# Altium footprint library Pezo_imp.PCBLIB: 98 footprints (part 2 of 7)
Each footprint in its own frame and in the unit in brackets; x right, y up, seen from the top. Pads: shape width x height; smd on the part's side, far side on the other; paste and mask are expansions set on the pad; w line width, h text height; cw(c..) or ccw(c..) is an arc to the next point about the centre after c.
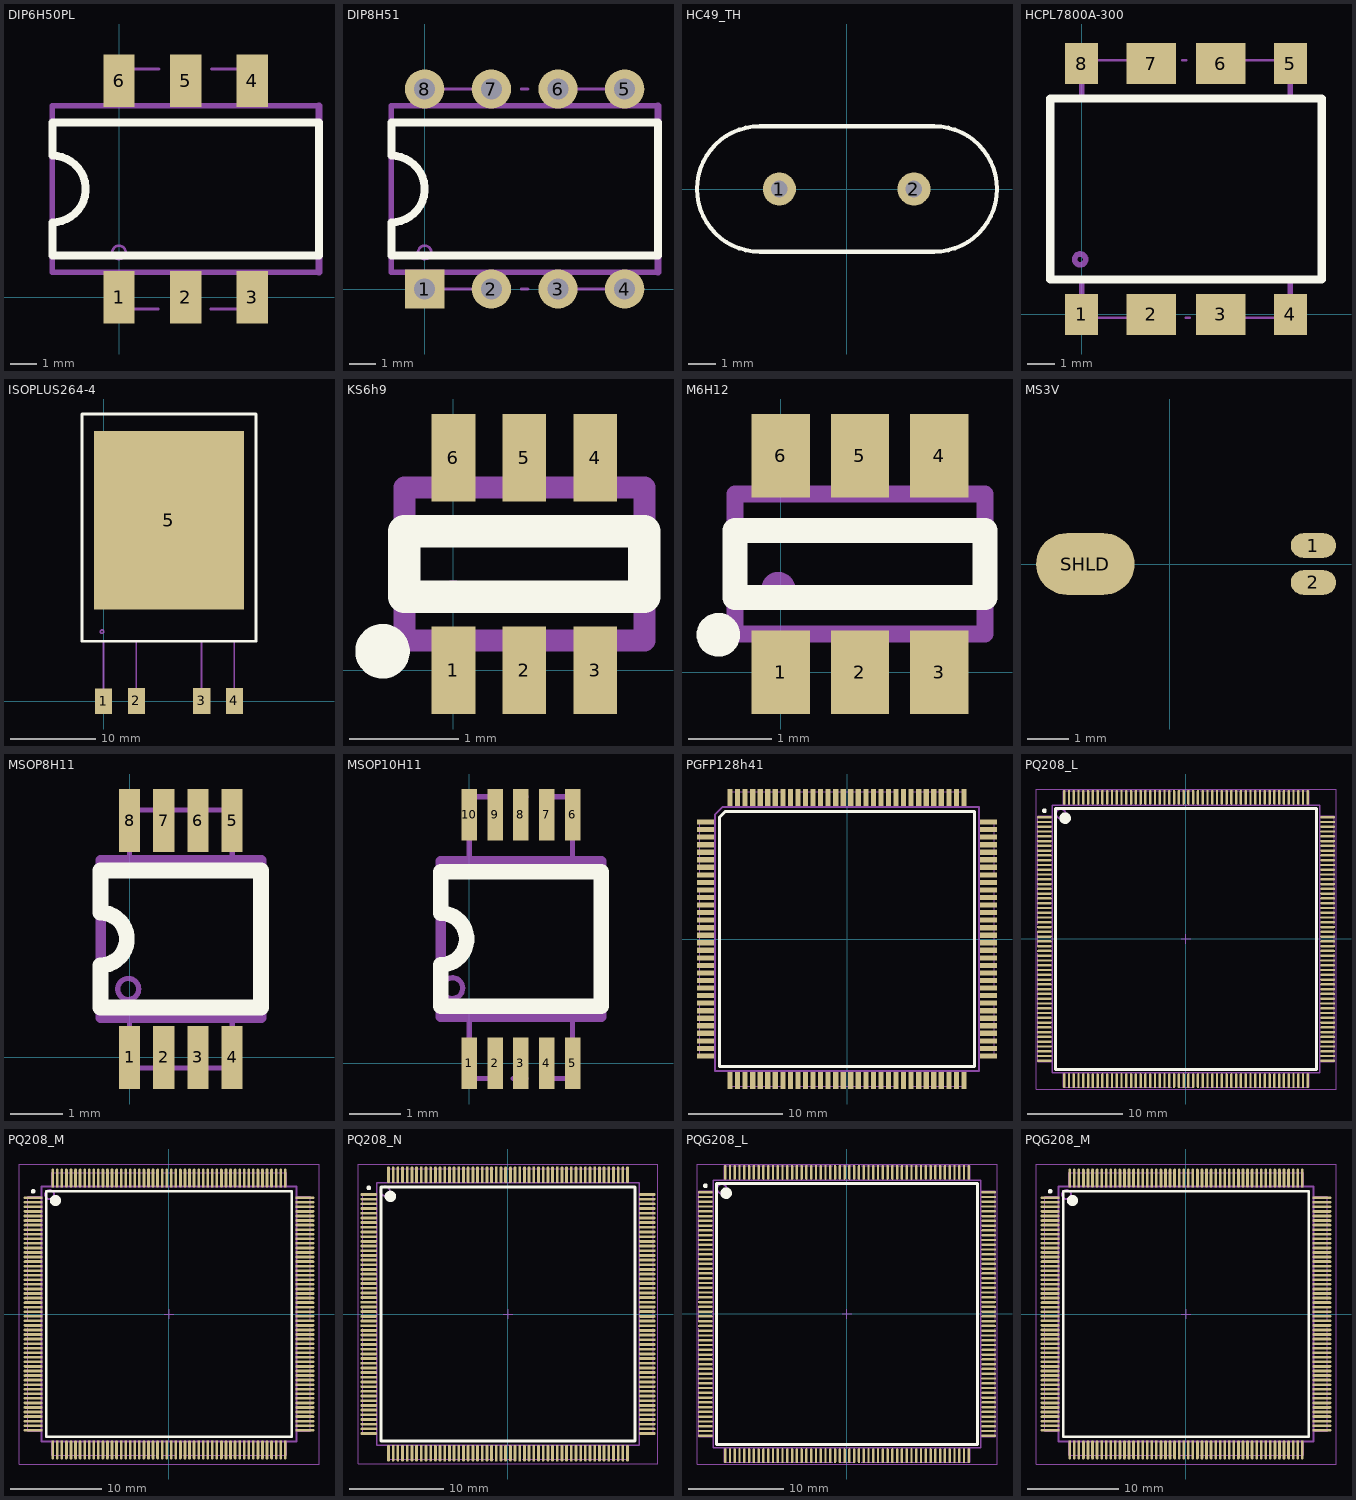
[diagram p1: the footprints below, top view; thin cyan lines are the x and y axes]

## DIP6H50PL [mm]
height 5
pads (6):
  rect 1.2x2 smd: 1(0,0) 2(2.54,0) 3(5.08,0) 4(5.08,8.255) 5(2.54,8.255) 6(0,8.255)
Top Overlay:
  lines w0.3: -2.54,1.587 7.62,1.587 7.62,6.667 -2.54,6.667 -2.54,5.397 cw(c-2.54,4.127) -2.54,2.857 -2.54,1.587
Mechanical 1:
  circle w0.1: c0,1.714 r0.254
  lines w0.025: -2.54,2.857 ccw(c-2.54,4.127) -2.54,5.397
  lines w0.1: 0,-0.445 1.5,-0.445 ; 0.024,8.7 1.524,8.7 ; 2.35,-0.464 2.604,-0.464 ; 2.374,8.68 2.628,8.68 ; 3.5,-0.445 5.1,-0.445 ; 3.524,8.7 5.124,8.7
  lines w0.2: 0,-0.445 0,0.953 ; 0.024,7.302 0.024,8.7 ; 5.1,-0.445 5.1,0.953 ; 5.124,7.302 5.124,8.7 ; 7.62,0.953 -2.54,0.953 -2.54,7.302 7.62,7.302
  lines w0.25: 7.62,0.953 7.62,7.302
  text "6" at -0.19,5.957 h1.5
  text ".Comment" at -0.21,2.99 h1.5
  text ".Designator" at 1.38,4.69 h1.5
3D body "DIP6h50pl.stp": height 5.02, standoff 0, extent -2.545,-0.423 7.615,8.677

## DIP8H51 [mm]
height 5.1
pads (8):
  rect 1.5x1.5 hole 0.8: 1(0,0)
  round 1.5 hole 0.8: 2(2.54,0) 3(5.08,0) 4(7.62,0) 5(7.62,7.62) 6(5.08,7.62) 7(2.54,7.62) 8(0,7.62)
Top Overlay:
  lines w0.3: -1.27,1.27 8.89,1.27 8.89,6.35 -1.27,6.35 -1.27,5.08 cw(c-1.27,3.81) -1.27,2.54 -1.27,1.27
Mechanical 1:
  circle w0.1: c0,1.397 r0.254
  lines w0.025: -1.27,2.54 ccw(c-1.27,3.81) -1.27,5.08
  lines w0.1: 0,0 2.54,0 ; 0,7.62 2.54,7.62 ; 3.683,0 3.937,0 ; 3.683,7.62 3.937,7.62 ; 5.08,0 7.62,0 ; 5.08,7.62 7.62,7.62
  lines w0.2: 0,0 0,0.635 ; 0,6.985 0,7.62 ; 7.62,0 7.62,0.635 ; 7.62,6.985 7.62,7.62 ; 8.89,0.635 -1.27,0.635 -1.27,6.985 8.89,6.985
  lines w0.25: 8.89,0.635 8.89,6.985
  text "8" at -0.19,5.64 h1.5
  text ".Comment" at 1.17,2.62 h1.5
  text ".Designator" at 2.76,4.32 h1.5
3D body "DIP8h51.stp": height 5.12, standoff -3, extent -1.325,-0.15 8.975,7.74

## HC49_TH [mm]
pads (2):
  round 1.2 hole 0.6: 1(-2.44,0) 2(2.44,0)
Top Overlay:
  lines w0.15: -3.15,-2.275 cw(c-3.15,0) -3.15,2.275 3.175,2.275 cw(c3.175,0) 3.175,-2.275 -3.15,-2.275
3D body "User Library-HC49S-1.STEP": height 3.61, standoff -2.99, extent -5.49,-2.245 5.49,2.246

## HCPL7800A-300 [mm]
height 5
pads (8):
  rect 1.2x1.5 smd: 1(0,0) 4(7.62,0) 5(7.62,9.144) 8(0,9.144)
  rect 1.8x1.5 smd: 2(2.54,0) 3(5.08,0) 6(5.08,9.144) 7(2.54,9.144)
Top Overlay:
  lines w0.3: -1.14,1.272 -1.14,7.872 8.76,7.872 8.76,1.272 -1.14,1.272
Mechanical 1:
  circle w0.2: c-0.05,2.004 r0.2
  lines w0.1: 0,-0.127 3.175,-0.127 ; 0,9.271 3.175,9.271 ; 3.683,9.271 3.81,9.271 ; 3.81,-0.127 3.937,-0.127 ; 4.445,-0.127 7.62,-0.127 ; 4.445,9.271 7.62,9.271
  lines w0.2: 0,-0.127 0,1.27 ; 0,7.874 0,9.271 ; 7.62,-0.127 7.62,1.27 ; 7.62,7.874 7.62,9.271 ; -1.14,1.272 -1.14,7.872 8.76,7.872 8.76,1.272 -1.14,1.272
  text "8" at -0.27,6.555 h1.5
  text ".Comment" at 1.51,3.61 h1.5
  text ".Designator" at 3.1,5.31 h1.5
3D body "HCPL7800A-300.stp": height 4.96, standoff 0, extent -1.14,-0.38 8.76,9.52

## ISOPLUS264-4 [mm]
height 5.21
pads (5):
  rect 2x3 smd: 1(0,0) 2(3.835,0.025) 3(11.455,0.025) 4(15.265,0.025)
  rect 17.53x20.85 smd: 5(7.632,21.113)
Top Overlay:
  lines w0.3: -2.518,7.013 17.782,7.013 17.782,33.513 -2.518,33.513 -2.518,7.013
Mechanical 1:
  circle w0.2: c-0.188,8.109 r0.2
  lines w0.2: 0,-1.004 0,6.953 ; 3.81,-1.004 3.81,6.966 ; 11.43,-1.004 11.43,6.953 ; 15.252,-1.004 15.252,6.997 ; -2.518,7.013 17.782,7.013 17.782,33.513 -2.518,33.513 -2.518,7.013
  text ".Designator" at 6.23,20.74 h1.5
  text ".Comment" at 4.64,19.04 h1.5
  text "4" at 14.871,8.109 h1.5
3D body "ISOPLUS264-4.stp": height 5.21, standoff 0, extent -2.53,-1.3 17.77,33.5

## KS6h9 [mm]
height 0.9
pads (6):
  rect 0.4x0.8 smd: 1(0,0) 2(0.65,0) 3(1.3,0) 4(1.3,1.95) 5(0.65,1.95) 6(0,1.95)
Top Overlay:
  circle w0.3: c-0.65,0.175 r0.1
  lines w0.3: -0.45,0.675 1.75,0.675 1.75,1.275 -0.45,1.275 -0.45,0.675
Mechanical 1:
  circle w0.2: c0,0.675 r0.05
  lines w0.2: 0,-0.225 0,0.275 ; 0,1.675 0,2.175 ; 0.65,-0.225 0.65,0.275 ; 0.65,1.675 0.65,2.175 ; 1.3,-0.225 1.3,0.275 ; 1.3,1.675 1.3,2.175 ; -0.45,0.275 -0.45,1.675 1.75,1.675 1.75,0.275 -0.45,0.275
  text "6" at -1.05,1.975 h1.5
  text ".Comment" at -1.89,-1.62 h1.5
  text ".Designator" at -0.09,2.65 h1.5
3D body "KS6h09.stp": height 0.91, standoff 0, extent -0.45,-0.13 1.75,2.07

## M6H12 [mm]
height 1.2
pads (6):
  rect 0.7x1 smd: 1(0,0) 2(0.95,0) 3(1.9,0) 4(1.9,2.6) 5(0.95,2.6) 6(0,2.6)
Top Overlay:
  circle w0.3: c-0.75,0.45 r0.112
  lines w0.3: -0.55,0.9 -0.55,1.7 2.45,1.7 2.45,0.9 -0.55,0.9
Mechanical 1:
  circle w0.25: c-0.03,1 r0.08
  lines w0.2: 0,-0.2 0,0.45 ; 0,2.15 0,2.8 ; 0.95,2.14 0.95,2.8 ; 1.9,-0.2 1.9,0.46 ; 1.9,2.15 1.9,2.8 ; -0.55,0.46 2.45,0.46 2.45,2.14 -0.55,2.14 -0.55,0.46 ; 0.95,-0.2 0.95,0.45 0.95,-0.2
  text "6" at -1.1,2.35 h1.5
  text ".Comment" at -1.84,-1.69 h1.5
  text ".Designator" at -0.04,3.49 h1.5
3D body "M6h12.stp": height 1.21, standoff 0, extent -0.5,-0.2 2.4,2.8

## MS3V [mm]
pads (3):
  oval 1.1x0.6 smd: 1(3.5,0.45) 2(3.5,-0.45)
  oval 2.4x1.5 smd: SHLD(-2.05,0)
3D body "User Library-MS2V-T1S.STEP": height 1.51, standoff 0.01, extent -3.2,-0.75 4,0.75

## MSOP8H11 [mm]
height 1.1
pads (8):
  rect 0.4x1.2 smd: 1(0,0) 2(0.65,0) 3(1.3,0) 4(1.95,0) 5(1.95,4.5) 6(1.3,4.5) 7(0.65,4.5) 8(0,4.5)
Top Overlay:
  lines w0.3: -0.55,0.95 2.5,0.95 2.5,3.55 -0.55,3.55 -0.55,2.75 cw(c-0.55,2.25) -0.55,1.75 -0.55,0.95
Mechanical 1:
  circle w0.1: c-0.025,1.3 r0.2
  lines w0.1: 0,0.75 0,-0.2 0.55,-0.2 ; 0,3.75 0,4.7 0.55,4.7 ; 0.85,-0.2 1.1,-0.2 ; 0.85,4.7 1.1,4.7 ; 1.4,-0.2 1.95,-0.2 1.95,0.75 ; 1.4,4.7 1.95,4.7 1.95,3.75
  lines w0.2: -0.55,0.75 2.5,0.75 2.5,3.75 -0.55,3.75 -0.55,0.75
  text ".Designator" at 0.2,5.18 h1.5
  text ".Comment" at -1.67,-1.45 h1.5
  text "8" at -0.127,2.413 h1.5
3D body "MSOP8h11.stp": height 1.11, standoff 0, extent -0.525,-0.2 2.475,4.7

## MSOP10H11 [mm]
height 1.1
pads (10):
  rect 0.3x1 smd: 1(0,0) 2(0.5,0) 3(1,0) 4(1.5,0) 5(2,0) 6(2,4.8) 7(1.5,4.8) 8(1,4.8) 9(0.5,4.8) 10(0,4.8)
Top Overlay:
  lines w0.3: -0.55,1.1 2.55,1.1 2.55,3.7 -0.55,3.7 -0.55,2.9 cw(c-0.55,2.4) -0.55,1.9 -0.55,1.1
Mechanical 1:
  circle w0.1: c-0.325,1.45 r0.2
  lines w0.1: -0.3,3.9 0,3.9 0,5.15 0.55,5.15 ; 0,0.9 0,0.6 0,-0.3 0.55,-0.3 ; 0.85,-0.3 1.1,-0.3 ; 0.9,5.15 1.1,5.15 ; 1.45,-0.3 2,-0.3 2,0.9 ; 1.45,5.15 2,5.15 2,3.9 2.3,3.9
  lines w0.2: -0.55,0.9 2.55,0.9 2.55,3.9 -0.55,3.9 -0.55,0.9
  text "10" at -0.427,2.563 h1.5
  text ".Comment" at -1.55,-1.55 h1.5
  text ".Designator" at 0.19,1.45 h1.5
3D body "MSOP10h11.stp": height 1.11, standoff 0, extent -0.55,-0.15 2.55,4.95

## PGFP128h41 [mm]
height 4.1
pads (128):
  rect 1.8x0.55 smd: 1(-15,12.4) 2(-15,11.6) 3(-15,10.8) 4(-15,10) 5(-15,9.2) 6(-15,8.4) 7(-15,7.6) 8(-15,6.8) 9(-15,6) 10(-15,5.2) 11(-15,4.4) 12(-15,3.6) 13(-15,2.8) 14(-15,2) 15(-15,1.2) 16(-15,0.4) 17(-15,-0.4) 18(-15,-1.2) 19(-15,-2) 20(-15,-2.8) 21(-15,-3.6) 22(-15,-4.4) 23(-15,-5.2) 24(-15,-6) 25(-15,-6.8) 26(-15,-7.6) 27(-15,-8.4) 28(-15,-9.2) 29(-15,-10) 30(-15,-10.8) 31(-15,-11.6) 32(-15,-12.4) 65(15,-12.4) 66(15,-11.6) 67(15,-10.8) 68(15,-10) 69(15,-9.2) 70(15,-8.4) 71(15,-7.6) 72(15,-6.8) 73(15,-6) 74(15,-5.2) 75(15,-4.4) 76(15,-3.6) 77(15,-2.8) 78(15,-2) 79(15,-1.2) 80(15,-0.4) 81(15,0.4) 82(15,1.2) 83(15,2) 84(15,2.8) 85(15,3.6) 86(15,4.4) 87(15,5.2) 88(15,6) 89(15,6.8) 90(15,7.6) 91(15,8.4) 92(15,9.2) 93(15,10) 94(15,10.8) 95(15,11.6) 96(15,12.4)
  rect 0.55x1.8 smd: 33(-12.4,-15) 34(-11.6,-15) 35(-10.8,-15) 36(-10,-15) 37(-9.2,-15) 38(-8.4,-15) 39(-7.6,-15) 40(-6.8,-15) 41(-6,-15) 42(-5.2,-15) 43(-4.4,-15) 44(-3.6,-15) 45(-2.8,-15) 46(-2,-15) 47(-1.2,-15) 48(-0.4,-15) 49(0.4,-15) 50(1.2,-15) 51(2,-15) 52(2.8,-15) 53(3.6,-15) 54(4.4,-15) 55(5.2,-15) 56(6,-15) 57(6.8,-15) 58(7.6,-15) 59(8.4,-15) 60(9.2,-15) 61(10,-15) 62(10.8,-15) 63(11.6,-15) 64(12.4,-15) 97(12.4,15) 98(11.6,15) 99(10.8,15) 100(10,15) 101(9.2,15) 102(8.4,15) 103(7.6,15) 104(6.8,15) 105(6,15) 106(5.2,15) 107(4.4,15) 108(3.6,15) 109(2.8,15) 110(2,15) 111(1.2,15) 112(0.4,15) 113(-0.4,15) 114(-1.2,15) 115(-2,15) 116(-2.8,15) 117(-3.6,15) 118(-4.4,15) 119(-5.2,15) 120(-6,15) 121(-6.8,15) 122(-7.6,15) 123(-8.4,15) 124(-9.2,15) 125(-10,15) 126(-10.8,15) 127(-11.6,15) 128(-12.4,15)
Top Overlay:
  lines w0.3: -13.5,-13.5 13.5,-13.5 13.5,13.5 -12.9,13.5 -13.5,12.9 -13.5,-13.5
Mechanical 1:
  lines w0.1: -15.6,-12.4 -15.6,-6.8 ; -15.6,-6.1 -15.6,-5.9 ; -15.6,-5.2 -15.6,5.2 ; -15.6,5.9 -15.6,6.1 ; -15.6,6.8 -15.6,12.4 ; -12.4,-15.6 -6.8,-15.6 ; -12.4,15.6 -6.8,15.6 ; -6.1,-15.6 -5.9,-15.6 ; -6.1,15.6 -5.9,15.6 ; -5.2,-15.6 5.2,-15.6 ; -5.2,15.6 5.2,15.6 ; 5.9,-15.6 6.1,-15.6 ; 5.9,15.6 6.1,15.6 ; 6.8,-15.6 12.4,-15.6 ; 6.8,15.6 12.4,15.6 ; 15.6,-12.4 15.6,-6.8 ; 15.6,-6.1 15.6,-5.9 ; 15.6,-5.2 15.6,5.2 ; 15.6,5.9 15.6,6.1 ; 15.6,6.8 15.6,12.4
  lines w0.2: -15.6,-12.4 -14,-12.4 ; -15.6,12.4 -14,12.4 ; -12.4,-15.6 -12.4,-14 ; -12.4,14 -12.4,15.6 ; 12.4,-15.6 12.4,-14 ; 12.4,14 12.4,15.6 ; 14,-12.4 15.6,-12.4 ; 14,12.4 15.6,12.4 ; -14,-14 14,-14 14,14 -13.178,14 -14,13.178 -14,-14
  text ".Comment" at -2.9,-1.7 h1.5
  text ".Designator" at -1.61,0.85 h1.5
  text "33" at -12.624,-13.257 h1.5
  text "32" at -12.5,-12 h1.5
  text "1" at -12.6,11.8 h1.5
  text "128" at -13,12.6 h1.5
  text "64" at 11.1,-13.4 h1.5
  text "65" at 13.2,-12.2 h1.5
  text "96" at 13.2,11.1 h1.5
  text "97" at 10.9,12.5 h1.5
3D body "PQFP128h41.stp": height 4.12, standoff 0, extent -15.6,-15.6 15.6,15.6

## PQ208_L [mm] "Shrink QFP, 208-Leads, Body 28x28mm, Pitch 0.5mm, IPC High Density"
height 4.1
pads (208):
  oval 1.55x0.25 smd: 1(-14.825,12.75) 2(-14.825,12.25) 3(-14.825,11.75) 4(-14.825,11.25) 5(-14.825,10.75) 6(-14.825,10.25) 7(-14.825,9.75) 8(-14.825,9.25) 9(-14.825,8.75) 10(-14.825,8.25) 11(-14.825,7.75) 12(-14.825,7.25) 13(-14.825,6.75) 14(-14.825,6.25) 15(-14.825,5.75) 16(-14.825,5.25) 17(-14.825,4.75) 18(-14.825,4.25) 19(-14.825,3.75) 20(-14.825,3.25) 21(-14.825,2.75) 22(-14.825,2.25) 23(-14.825,1.75) 24(-14.825,1.25) 25(-14.825,0.75) 26(-14.825,0.25) 27(-14.825,-0.25) 28(-14.825,-0.75) 29(-14.825,-1.25) 30(-14.825,-1.75) 31(-14.825,-2.25) 32(-14.825,-2.75) 33(-14.825,-3.25) 34(-14.825,-3.75) 35(-14.825,-4.25) 36(-14.825,-4.75) 37(-14.825,-5.25) 38(-14.825,-5.75) 39(-14.825,-6.25) 40(-14.825,-6.75) 41(-14.825,-7.25) 42(-14.825,-7.75) 43(-14.825,-8.25) 44(-14.825,-8.75) 45(-14.825,-9.25) 46(-14.825,-9.75) 47(-14.825,-10.25) 48(-14.825,-10.75) 49(-14.825,-11.25) 50(-14.825,-11.75) 51(-14.825,-12.25) 52(-14.825,-12.75) 105(14.825,-12.75) 106(14.825,-12.25) 107(14.825,-11.75) 108(14.825,-11.25) 109(14.825,-10.75) 110(14.825,-10.25) 111(14.825,-9.75) 112(14.825,-9.25) 113(14.825,-8.75) 114(14.825,-8.25) 115(14.825,-7.75) 116(14.825,-7.25) 117(14.825,-6.75) 118(14.825,-6.25) 119(14.825,-5.75) 120(14.825,-5.25) 121(14.825,-4.75) 122(14.825,-4.25) 123(14.825,-3.75) 124(14.825,-3.25) 125(14.825,-2.75) 126(14.825,-2.25) 127(14.825,-1.75) 128(14.825,-1.25) 129(14.825,-0.75) 130(14.825,-0.25) 131(14.825,0.25) 132(14.825,0.75) 133(14.825,1.25) 134(14.825,1.75) 135(14.825,2.25) 136(14.825,2.75) 137(14.825,3.25) 138(14.825,3.75) 139(14.825,4.25) 140(14.825,4.75) 141(14.825,5.25) 142(14.825,5.75) 143(14.825,6.25) 144(14.825,6.75) 145(14.825,7.25) 146(14.825,7.75) 147(14.825,8.25) 148(14.825,8.75) 149(14.825,9.25) 150(14.825,9.75) 151(14.825,10.25) 152(14.825,10.75) 153(14.825,11.25) 154(14.825,11.75) 155(14.825,12.25) 156(14.825,12.75)
  oval 0.25x1.55 smd: 53(-12.75,-14.825) 54(-12.25,-14.825) 55(-11.75,-14.825) 56(-11.25,-14.825) 57(-10.75,-14.825) 58(-10.25,-14.825) 59(-9.75,-14.825) 60(-9.25,-14.825) 61(-8.75,-14.825) 62(-8.25,-14.825) 63(-7.75,-14.825) 64(-7.25,-14.825) 65(-6.75,-14.825) 66(-6.25,-14.825) 67(-5.75,-14.825) 68(-5.25,-14.825) 69(-4.75,-14.825) 70(-4.25,-14.825) 71(-3.75,-14.825) 72(-3.25,-14.825) 73(-2.75,-14.825) 74(-2.25,-14.825) 75(-1.75,-14.825) 76(-1.25,-14.825) 77(-0.75,-14.825) 78(-0.25,-14.825) 79(0.25,-14.825) 80(0.75,-14.825) 81(1.25,-14.825) 82(1.75,-14.825) 83(2.25,-14.825) 84(2.75,-14.825) 85(3.25,-14.825) 86(3.75,-14.825) 87(4.25,-14.825) 88(4.75,-14.825) 89(5.25,-14.825) 90(5.75,-14.825) 91(6.25,-14.825) 92(6.75,-14.825) 93(7.25,-14.825) 94(7.75,-14.825) 95(8.25,-14.825) 96(8.75,-14.825) 97(9.25,-14.825) 98(9.75,-14.825) 99(10.25,-14.825) 100(10.75,-14.825) 101(11.25,-14.825) 102(11.75,-14.825) 103(12.25,-14.825) 104(12.75,-14.825) 157(12.75,14.825) 158(12.25,14.825) 159(11.75,14.825) 160(11.25,14.825) 161(10.75,14.825) 162(10.25,14.825) 163(9.75,14.825) 164(9.25,14.825) 165(8.75,14.825) 166(8.25,14.825) 167(7.75,14.825) 168(7.25,14.825) 169(6.75,14.825) 170(6.25,14.825) 171(5.75,14.825) 172(5.25,14.825) 173(4.75,14.825) 174(4.25,14.825) 175(3.75,14.825) 176(3.25,14.825) 177(2.75,14.825) 178(2.25,14.825) 179(1.75,14.825) 180(1.25,14.825) 181(0.75,14.825) 182(0.25,14.825) 183(-0.25,14.825) 184(-0.75,14.825) 185(-1.25,14.825) 186(-1.75,14.825) 187(-2.25,14.825) 188(-2.75,14.825) 189(-3.25,14.825) 190(-3.75,14.825) 191(-4.25,14.825) 192(-4.75,14.825) 193(-5.25,14.825) 194(-5.75,14.825) 195(-6.25,14.825) 196(-6.75,14.825) 197(-7.25,14.825) 198(-7.75,14.825) 199(-8.25,14.825) 200(-8.75,14.825) 201(-9.25,14.825) 202(-9.75,14.825) 203(-10.25,14.825) 204(-10.75,14.825) 205(-11.25,14.825) 206(-11.75,14.825) 207(-12.25,14.825) 208(-12.75,14.825)
Top Overlay:
  circle w0.6: c-12.65,12.65 r0.3
  circle w0.25: c-14.825,13.425 r0.125
  lines w0.3: -13.65,-13.65 13.65,-13.65 13.65,13.65 -13.65,13.65 -13.65,-13.65
Mechanical 1:
  circle w0.2: c-13.1,13.1 r0.5
  lines w0.1: -15.494,-12.827 -15.494,-1.5 ; -15.494,-0.762 -15.494,0.762 ; -15.494,1.5 -15.494,12.827 ; -12.827,-15.494 -1.5,-15.494 ; -12.827,15.494 -1.5,15.494 ; -0.762,-15.494 0.762,-15.494 ; -0.762,15.494 0.762,15.494 ; 1.5,-15.494 12.827,-15.494 ; 1.5,15.494 12.827,15.494 ; 15.494,-12.827 15.494,-1.5 ; 15.494,-0.762 15.494,0.762 ; 15.494,1.5 15.494,12.827
  lines w0.2: -15.494,-12.827 -14,-12.827 ; -15.494,12.827 -14,12.827 ; -12.827,-15.494 -12.827,-14 ; -12.827,14 -12.827,15.494 ; 12.827,-15.494 12.827,-14 ; 12.827,14 12.827,15.494 ; 14,-12.827 15.494,-12.827 ; 14,12.827 15.494,12.827 ; -14,-14 14,-14 14,14 -14,14 -14,-14
  text ".Comment" at -2.9,-1.7 h1.5
  text ".Designator" at -1.61,0.85 h1.5
Mechanical 15:
  lines w0.1: -0.5,0 0.5,0 ; 0,-0.5 0,0.5 ; -15.7,-15.7 15.7,-15.7 15.7,15.7 -15.7,15.7 -15.7,-15.7
3D body: height 4.1, standoff 0, extent -14,-14 14,14

## PQ208_M [mm] "Shrink QFP, 208-Leads, Body 28x28mm, Pitch 0.5mm, IPC Low Density"
height 4.1
pads (208):
  oval 2.1x0.3 smd: 1(-14.9,12.75) 2(-14.9,12.25) 3(-14.9,11.75) 4(-14.9,11.25) 5(-14.9,10.75) 6(-14.9,10.25) 7(-14.9,9.75) 8(-14.9,9.25) 9(-14.9,8.75) 10(-14.9,8.25) 11(-14.9,7.75) 12(-14.9,7.25) 13(-14.9,6.75) 14(-14.9,6.25) 15(-14.9,5.75) 16(-14.9,5.25) 17(-14.9,4.75) 18(-14.9,4.25) 19(-14.9,3.75) 20(-14.9,3.25) 21(-14.9,2.75) 22(-14.9,2.25) 23(-14.9,1.75) 24(-14.9,1.25) 25(-14.9,0.75) 26(-14.9,0.25) 27(-14.9,-0.25) 28(-14.9,-0.75) 29(-14.9,-1.25) 30(-14.9,-1.75) 31(-14.9,-2.25) 32(-14.9,-2.75) 33(-14.9,-3.25) 34(-14.9,-3.75) 35(-14.9,-4.25) 36(-14.9,-4.75) 37(-14.9,-5.25) 38(-14.9,-5.75) 39(-14.9,-6.25) 40(-14.9,-6.75) 41(-14.9,-7.25) 42(-14.9,-7.75) 43(-14.9,-8.25) 44(-14.9,-8.75) 45(-14.9,-9.25) 46(-14.9,-9.75) 47(-14.9,-10.25) 48(-14.9,-10.75) 49(-14.9,-11.25) 50(-14.9,-11.75) 51(-14.9,-12.25) 52(-14.9,-12.75) 105(14.9,-12.75) 106(14.9,-12.25) 107(14.9,-11.75) 108(14.9,-11.25) 109(14.9,-10.75) 110(14.9,-10.25) 111(14.9,-9.75) 112(14.9,-9.25) 113(14.9,-8.75) 114(14.9,-8.25) 115(14.9,-7.75) 116(14.9,-7.25) 117(14.9,-6.75) 118(14.9,-6.25) 119(14.9,-5.75) 120(14.9,-5.25) 121(14.9,-4.75) 122(14.9,-4.25) 123(14.9,-3.75) 124(14.9,-3.25) 125(14.9,-2.75) 126(14.9,-2.25) 127(14.9,-1.75) 128(14.9,-1.25) 129(14.9,-0.75) 130(14.9,-0.25) 131(14.9,0.25) 132(14.9,0.75) 133(14.9,1.25) 134(14.9,1.75) 135(14.9,2.25) 136(14.9,2.75) 137(14.9,3.25) 138(14.9,3.75) 139(14.9,4.25) 140(14.9,4.75) 141(14.9,5.25) 142(14.9,5.75) 143(14.9,6.25) 144(14.9,6.75) 145(14.9,7.25) 146(14.9,7.75) 147(14.9,8.25) 148(14.9,8.75) 149(14.9,9.25) 150(14.9,9.75) 151(14.9,10.25) 152(14.9,10.75) 153(14.9,11.25) 154(14.9,11.75) 155(14.9,12.25) 156(14.9,12.75)
  oval 0.3x2.1 smd: 53(-12.75,-14.9) 54(-12.25,-14.9) 55(-11.75,-14.9) 56(-11.25,-14.9) 57(-10.75,-14.9) 58(-10.25,-14.9) 59(-9.75,-14.9) 60(-9.25,-14.9) 61(-8.75,-14.9) 62(-8.25,-14.9) 63(-7.75,-14.9) 64(-7.25,-14.9) 65(-6.75,-14.9) 66(-6.25,-14.9) 67(-5.75,-14.9) 68(-5.25,-14.9) 69(-4.75,-14.9) 70(-4.25,-14.9) 71(-3.75,-14.9) 72(-3.25,-14.9) 73(-2.75,-14.9) 74(-2.25,-14.9) 75(-1.75,-14.9) 76(-1.25,-14.9) 77(-0.75,-14.9) 78(-0.25,-14.9) 79(0.25,-14.9) 80(0.75,-14.9) 81(1.25,-14.9) 82(1.75,-14.9) 83(2.25,-14.9) 84(2.75,-14.9) 85(3.25,-14.9) 86(3.75,-14.9) 87(4.25,-14.9) 88(4.75,-14.9) 89(5.25,-14.9) 90(5.75,-14.9) 91(6.25,-14.9) 92(6.75,-14.9) 93(7.25,-14.9) 94(7.75,-14.9) 95(8.25,-14.9) 96(8.75,-14.9) 97(9.25,-14.9) 98(9.75,-14.9) 99(10.25,-14.9) 100(10.75,-14.9) 101(11.25,-14.9) 102(11.75,-14.9) 103(12.25,-14.9) 104(12.75,-14.9) 157(12.75,14.9) 158(12.25,14.9) 159(11.75,14.9) 160(11.25,14.9) 161(10.75,14.9) 162(10.25,14.9) 163(9.75,14.9) 164(9.25,14.9) 165(8.75,14.9) 166(8.25,14.9) 167(7.75,14.9) 168(7.25,14.9) 169(6.75,14.9) 170(6.25,14.9) 171(5.75,14.9) 172(5.25,14.9) 173(4.75,14.9) 174(4.25,14.9) 175(3.75,14.9) 176(3.25,14.9) 177(2.75,14.9) 178(2.25,14.9) 179(1.75,14.9) 180(1.25,14.9) 181(0.75,14.9) 182(0.25,14.9) 183(-0.25,14.9) 184(-0.75,14.9) 185(-1.25,14.9) 186(-1.75,14.9) 187(-2.25,14.9) 188(-2.75,14.9) 189(-3.25,14.9) 190(-3.75,14.9) 191(-4.25,14.9) 192(-4.75,14.9) 193(-5.25,14.9) 194(-5.75,14.9) 195(-6.25,14.9) 196(-6.75,14.9) 197(-7.25,14.9) 198(-7.75,14.9) 199(-8.25,14.9) 200(-8.75,14.9) 201(-9.25,14.9) 202(-9.75,14.9) 203(-10.25,14.9) 204(-10.75,14.9) 205(-11.25,14.9) 206(-11.75,14.9) 207(-12.25,14.9) 208(-12.75,14.9)
Top Overlay:
  circle w0.6: c-12.45,12.45 r0.3
  circle w0.25: c-14.9,13.45 r0.125
  lines w0.3: -13.45,-13.45 13.45,-13.45 13.45,13.45 -13.45,13.45 -13.45,-13.45
Mechanical 1:
  circle w0.2: c-13.1,13.1 r0.5
  lines w0.1: -15.494,-12.827 -15.494,-1.5 ; -15.494,-0.762 -15.494,0.762 ; -15.494,1.5 -15.494,12.827 ; -12.827,-15.494 -1.5,-15.494 ; -12.827,15.494 -1.5,15.494 ; -0.762,-15.494 0.762,-15.494 ; -0.762,15.494 0.762,15.494 ; 1.5,-15.494 12.827,-15.494 ; 1.5,15.494 12.827,15.494 ; 15.494,-12.827 15.494,-1.5 ; 15.494,-0.762 15.494,0.762 ; 15.494,1.5 15.494,12.827
  lines w0.2: -15.494,-12.827 -14,-12.827 ; -15.494,12.827 -14,12.827 ; -12.827,-15.494 -12.827,-14 ; -12.827,14 -12.827,15.494 ; 12.827,-15.494 12.827,-14 ; 12.827,14 12.827,15.494 ; 14,-12.827 15.494,-12.827 ; 14,12.827 15.494,12.827 ; -14,-14 14,-14 14,14 -14,14 -14,-14
  text ".Designator" at -1.61,0.85 h1.5
  text ".Comment" at -2.9,-1.7 h1.5
Mechanical 15:
  lines w0.1: -0.5,0 0.5,0 ; 0,-0.5 0,0.5 ; -16.45,-16.45 16.45,-16.45 16.45,16.45 -16.45,16.45 -16.45,-16.45
3D body: height 4.1, standoff 0, extent -14,-14 14,14

## PQ208_N [mm] "Shrink QFP, 208-Leads, Body 28x28mm, Pitch 0.5mm, IPC Medium Density"
height 4.1
pads (208):
  oval 1.8x0.3 smd: 1(-14.85,12.75) 2(-14.85,12.25) 3(-14.85,11.75) 4(-14.85,11.25) 5(-14.85,10.75) 6(-14.85,10.25) 7(-14.85,9.75) 8(-14.85,9.25) 9(-14.85,8.75) 10(-14.85,8.25) 11(-14.85,7.75) 12(-14.85,7.25) 13(-14.85,6.75) 14(-14.85,6.25) 15(-14.85,5.75) 16(-14.85,5.25) 17(-14.85,4.75) 18(-14.85,4.25) 19(-14.85,3.75) 20(-14.85,3.25) 21(-14.85,2.75) 22(-14.85,2.25) 23(-14.85,1.75) 24(-14.85,1.25) 25(-14.85,0.75) 26(-14.85,0.25) 27(-14.85,-0.25) 28(-14.85,-0.75) 29(-14.85,-1.25) 30(-14.85,-1.75) 31(-14.85,-2.25) 32(-14.85,-2.75) 33(-14.85,-3.25) 34(-14.85,-3.75) 35(-14.85,-4.25) 36(-14.85,-4.75) 37(-14.85,-5.25) 38(-14.85,-5.75) 39(-14.85,-6.25) 40(-14.85,-6.75) 41(-14.85,-7.25) 42(-14.85,-7.75) 43(-14.85,-8.25) 44(-14.85,-8.75) 45(-14.85,-9.25) 46(-14.85,-9.75) 47(-14.85,-10.25) 48(-14.85,-10.75) 49(-14.85,-11.25) 50(-14.85,-11.75) 51(-14.85,-12.25) 52(-14.85,-12.75) 105(14.85,-12.75) 106(14.85,-12.25) 107(14.85,-11.75) 108(14.85,-11.25) 109(14.85,-10.75) 110(14.85,-10.25) 111(14.85,-9.75) 112(14.85,-9.25) 113(14.85,-8.75) 114(14.85,-8.25) 115(14.85,-7.75) 116(14.85,-7.25) 117(14.85,-6.75) 118(14.85,-6.25) 119(14.85,-5.75) 120(14.85,-5.25) 121(14.85,-4.75) 122(14.85,-4.25) 123(14.85,-3.75) 124(14.85,-3.25) 125(14.85,-2.75) 126(14.85,-2.25) 127(14.85,-1.75) 128(14.85,-1.25) 129(14.85,-0.75) 130(14.85,-0.25) 131(14.85,0.25) 132(14.85,0.75) 133(14.85,1.25) 134(14.85,1.75) 135(14.85,2.25) 136(14.85,2.75) 137(14.85,3.25) 138(14.85,3.75) 139(14.85,4.25) 140(14.85,4.75) 141(14.85,5.25) 142(14.85,5.75) 143(14.85,6.25) 144(14.85,6.75) 145(14.85,7.25) 146(14.85,7.75) 147(14.85,8.25) 148(14.85,8.75) 149(14.85,9.25) 150(14.85,9.75) 151(14.85,10.25) 152(14.85,10.75) 153(14.85,11.25) 154(14.85,11.75) 155(14.85,12.25) 156(14.85,12.75)
  oval 0.3x1.8 smd: 53(-12.75,-14.85) 54(-12.25,-14.85) 55(-11.75,-14.85) 56(-11.25,-14.85) 57(-10.75,-14.85) 58(-10.25,-14.85) 59(-9.75,-14.85) 60(-9.25,-14.85) 61(-8.75,-14.85) 62(-8.25,-14.85) 63(-7.75,-14.85) 64(-7.25,-14.85) 65(-6.75,-14.85) 66(-6.25,-14.85) 67(-5.75,-14.85) 68(-5.25,-14.85) 69(-4.75,-14.85) 70(-4.25,-14.85) 71(-3.75,-14.85) 72(-3.25,-14.85) 73(-2.75,-14.85) 74(-2.25,-14.85) 75(-1.75,-14.85) 76(-1.25,-14.85) 77(-0.75,-14.85) 78(-0.25,-14.85) 79(0.25,-14.85) 80(0.75,-14.85) 81(1.25,-14.85) 82(1.75,-14.85) 83(2.25,-14.85) 84(2.75,-14.85) 85(3.25,-14.85) 86(3.75,-14.85) 87(4.25,-14.85) 88(4.75,-14.85) 89(5.25,-14.85) 90(5.75,-14.85) 91(6.25,-14.85) 92(6.75,-14.85) 93(7.25,-14.85) 94(7.75,-14.85) 95(8.25,-14.85) 96(8.75,-14.85) 97(9.25,-14.85) 98(9.75,-14.85) 99(10.25,-14.85) 100(10.75,-14.85) 101(11.25,-14.85) 102(11.75,-14.85) 103(12.25,-14.85) 104(12.75,-14.85) 157(12.75,14.85) 158(12.25,14.85) 159(11.75,14.85) 160(11.25,14.85) 161(10.75,14.85) 162(10.25,14.85) 163(9.75,14.85) 164(9.25,14.85) 165(8.75,14.85) 166(8.25,14.85) 167(7.75,14.85) 168(7.25,14.85) 169(6.75,14.85) 170(6.25,14.85) 171(5.75,14.85) 172(5.25,14.85) 173(4.75,14.85) 174(4.25,14.85) 175(3.75,14.85) 176(3.25,14.85) 177(2.75,14.85) 178(2.25,14.85) 179(1.75,14.85) 180(1.25,14.85) 181(0.75,14.85) 182(0.25,14.85) 183(-0.25,14.85) 184(-0.75,14.85) 185(-1.25,14.85) 186(-1.75,14.85) 187(-2.25,14.85) 188(-2.75,14.85) 189(-3.25,14.85) 190(-3.75,14.85) 191(-4.25,14.85) 192(-4.75,14.85) 193(-5.25,14.85) 194(-5.75,14.85) 195(-6.25,14.85) 196(-6.75,14.85) 197(-7.25,14.85) 198(-7.75,14.85) 199(-8.25,14.85) 200(-8.75,14.85) 201(-9.25,14.85) 202(-9.75,14.85) 203(-10.25,14.85) 204(-10.75,14.85) 205(-11.25,14.85) 206(-11.75,14.85) 207(-12.25,14.85) 208(-12.75,14.85)
Top Overlay:
  circle w0.6: c-12.55,12.55 r0.3
  circle w0.25: c-14.85,13.45 r0.125
  lines w0.3: -13.55,-13.55 13.55,-13.55 13.55,13.55 -13.55,13.55 -13.55,-13.55
Mechanical 1:
  circle w0.2: c-13.1,13.1 r0.5
  lines w0.1: -15.494,-12.827 -15.494,-1.5 ; -15.494,-0.762 -15.494,0.762 ; -15.494,1.5 -15.494,12.827 ; -12.827,-15.494 -1.5,-15.494 ; -12.827,15.494 -1.5,15.494 ; -0.762,-15.494 0.762,-15.494 ; -0.762,15.494 0.762,15.494 ; 1.5,-15.494 12.827,-15.494 ; 1.5,15.494 12.827,15.494 ; 15.494,-12.827 15.494,-1.5 ; 15.494,-0.762 15.494,0.762 ; 15.494,1.5 15.494,12.827
  lines w0.2: -15.494,-12.827 -14,-12.827 ; -15.494,12.827 -14,12.827 ; -12.827,-15.494 -12.827,-14 ; -12.827,14 -12.827,15.494 ; 12.827,-15.494 12.827,-14 ; 12.827,14 12.827,15.494 ; 14,-12.827 15.494,-12.827 ; 14,12.827 15.494,12.827 ; -14,-14 14,-14 14,14 -14,14 -14,-14
  text ".Designator" at -1.61,0.85 h1.5
  text ".Comment" at -2.9,-1.7 h1.5
Mechanical 15:
  lines w0.1: -0.5,0 0.5,0 ; 0,-0.5 0,0.5 ; -16,-16 16,-16 16,16 -16,16 -16,-16
3D body: height 4.1, standoff 0, extent -14,-14 14,14

## PQG208_L [mm] "Shrink QFP, 208-Leads, Body 28x28mm, Pitch 0.5mm, IPC High Density"
height 4.1
pads (208):
  oval 1.55x0.25 smd: 1(-14.825,12.75) 2(-14.825,12.25) 3(-14.825,11.75) 4(-14.825,11.25) 5(-14.825,10.75) 6(-14.825,10.25) 7(-14.825,9.75) 8(-14.825,9.25) 9(-14.825,8.75) 10(-14.825,8.25) 11(-14.825,7.75) 12(-14.825,7.25) 13(-14.825,6.75) 14(-14.825,6.25) 15(-14.825,5.75) 16(-14.825,5.25) 17(-14.825,4.75) 18(-14.825,4.25) 19(-14.825,3.75) 20(-14.825,3.25) 21(-14.825,2.75) 22(-14.825,2.25) 23(-14.825,1.75) 24(-14.825,1.25) 25(-14.825,0.75) 26(-14.825,0.25) 27(-14.825,-0.25) 28(-14.825,-0.75) 29(-14.825,-1.25) 30(-14.825,-1.75) 31(-14.825,-2.25) 32(-14.825,-2.75) 33(-14.825,-3.25) 34(-14.825,-3.75) 35(-14.825,-4.25) 36(-14.825,-4.75) 37(-14.825,-5.25) 38(-14.825,-5.75) 39(-14.825,-6.25) 40(-14.825,-6.75) 41(-14.825,-7.25) 42(-14.825,-7.75) 43(-14.825,-8.25) 44(-14.825,-8.75) 45(-14.825,-9.25) 46(-14.825,-9.75) 47(-14.825,-10.25) 48(-14.825,-10.75) 49(-14.825,-11.25) 50(-14.825,-11.75) 51(-14.825,-12.25) 52(-14.825,-12.75) 105(14.825,-12.75) 106(14.825,-12.25) 107(14.825,-11.75) 108(14.825,-11.25) 109(14.825,-10.75) 110(14.825,-10.25) 111(14.825,-9.75) 112(14.825,-9.25) 113(14.825,-8.75) 114(14.825,-8.25) 115(14.825,-7.75) 116(14.825,-7.25) 117(14.825,-6.75) 118(14.825,-6.25) 119(14.825,-5.75) 120(14.825,-5.25) 121(14.825,-4.75) 122(14.825,-4.25) 123(14.825,-3.75) 124(14.825,-3.25) 125(14.825,-2.75) 126(14.825,-2.25) 127(14.825,-1.75) 128(14.825,-1.25) 129(14.825,-0.75) 130(14.825,-0.25) 131(14.825,0.25) 132(14.825,0.75) 133(14.825,1.25) 134(14.825,1.75) 135(14.825,2.25) 136(14.825,2.75) 137(14.825,3.25) 138(14.825,3.75) 139(14.825,4.25) 140(14.825,4.75) 141(14.825,5.25) 142(14.825,5.75) 143(14.825,6.25) 144(14.825,6.75) 145(14.825,7.25) 146(14.825,7.75) 147(14.825,8.25) 148(14.825,8.75) 149(14.825,9.25) 150(14.825,9.75) 151(14.825,10.25) 152(14.825,10.75) 153(14.825,11.25) 154(14.825,11.75) 155(14.825,12.25) 156(14.825,12.75)
  oval 0.25x1.55 smd: 53(-12.75,-14.825) 54(-12.25,-14.825) 55(-11.75,-14.825) 56(-11.25,-14.825) 57(-10.75,-14.825) 58(-10.25,-14.825) 59(-9.75,-14.825) 60(-9.25,-14.825) 61(-8.75,-14.825) 62(-8.25,-14.825) 63(-7.75,-14.825) 64(-7.25,-14.825) 65(-6.75,-14.825) 66(-6.25,-14.825) 67(-5.75,-14.825) 68(-5.25,-14.825) 69(-4.75,-14.825) 70(-4.25,-14.825) 71(-3.75,-14.825) 72(-3.25,-14.825) 73(-2.75,-14.825) 74(-2.25,-14.825) 75(-1.75,-14.825) 76(-1.25,-14.825) 77(-0.75,-14.825) 78(-0.25,-14.825) 79(0.25,-14.825) 80(0.75,-14.825) 81(1.25,-14.825) 82(1.75,-14.825) 83(2.25,-14.825) 84(2.75,-14.825) 85(3.25,-14.825) 86(3.75,-14.825) 87(4.25,-14.825) 88(4.75,-14.825) 89(5.25,-14.825) 90(5.75,-14.825) 91(6.25,-14.825) 92(6.75,-14.825) 93(7.25,-14.825) 94(7.75,-14.825) 95(8.25,-14.825) 96(8.75,-14.825) 97(9.25,-14.825) 98(9.75,-14.825) 99(10.25,-14.825) 100(10.75,-14.825) 101(11.25,-14.825) 102(11.75,-14.825) 103(12.25,-14.825) 104(12.75,-14.825) 157(12.75,14.825) 158(12.25,14.825) 159(11.75,14.825) 160(11.25,14.825) 161(10.75,14.825) 162(10.25,14.825) 163(9.75,14.825) 164(9.25,14.825) 165(8.75,14.825) 166(8.25,14.825) 167(7.75,14.825) 168(7.25,14.825) 169(6.75,14.825) 170(6.25,14.825) 171(5.75,14.825) 172(5.25,14.825) 173(4.75,14.825) 174(4.25,14.825) 175(3.75,14.825) 176(3.25,14.825) 177(2.75,14.825) 178(2.25,14.825) 179(1.75,14.825) 180(1.25,14.825) 181(0.75,14.825) 182(0.25,14.825) 183(-0.25,14.825) 184(-0.75,14.825) 185(-1.25,14.825) 186(-1.75,14.825) 187(-2.25,14.825) 188(-2.75,14.825) 189(-3.25,14.825) 190(-3.75,14.825) 191(-4.25,14.825) 192(-4.75,14.825) 193(-5.25,14.825) 194(-5.75,14.825) 195(-6.25,14.825) 196(-6.75,14.825) 197(-7.25,14.825) 198(-7.75,14.825) 199(-8.25,14.825) 200(-8.75,14.825) 201(-9.25,14.825) 202(-9.75,14.825) 203(-10.25,14.825) 204(-10.75,14.825) 205(-11.25,14.825) 206(-11.75,14.825) 207(-12.25,14.825) 208(-12.75,14.825)
Top Overlay:
  circle w0.6: c-12.65,12.65 r0.3
  circle w0.25: c-14.825,13.425 r0.125
  lines w0.3: -13.65,-13.65 13.65,-13.65 13.65,13.65 -13.65,13.65 -13.65,-13.65
Mechanical 1:
  circle w0.2: c-13.1,13.1 r0.5
  lines w0.1: -15.494,-12.827 -15.494,-1.5 ; -15.494,-0.762 -15.494,0.762 ; -15.494,1.5 -15.494,12.827 ; -12.827,-15.494 -1.5,-15.494 ; -12.827,15.494 -1.5,15.494 ; -0.762,-15.494 0.762,-15.494 ; -0.762,15.494 0.762,15.494 ; 1.5,-15.494 12.827,-15.494 ; 1.5,15.494 12.827,15.494 ; 15.494,-12.827 15.494,-1.5 ; 15.494,-0.762 15.494,0.762 ; 15.494,1.5 15.494,12.827
  lines w0.2: -15.494,-12.827 -14,-12.827 ; -15.494,12.827 -14,12.827 ; -12.827,-15.494 -12.827,-14 ; -12.827,14 -12.827,15.494 ; 12.827,-15.494 12.827,-14 ; 12.827,14 12.827,15.494 ; 14,-12.827 15.494,-12.827 ; 14,12.827 15.494,12.827 ; -14,-14 14,-14 14,14 -14,14 -14,-14
  text ".Designator" at -1.61,0.85 h1.5
  text ".Comment" at -2.9,-1.7 h1.5
Mechanical 15:
  lines w0.1: -0.5,0 0.5,0 ; 0,-0.5 0,0.5 ; -15.7,-15.7 15.7,-15.7 15.7,15.7 -15.7,15.7 -15.7,-15.7
3D body: height 4.1, standoff 0, extent -14,-14 14,14

## PQG208_M [mm] "Shrink QFP, 208-Leads, Body 28x28mm, Pitch 0.5mm, IPC Low Density"
height 4.1
pads (208):
  oval 2.1x0.3 smd: 1(-14.9,12.75) 2(-14.9,12.25) 3(-14.9,11.75) 4(-14.9,11.25) 5(-14.9,10.75) 6(-14.9,10.25) 7(-14.9,9.75) 8(-14.9,9.25) 9(-14.9,8.75) 10(-14.9,8.25) 11(-14.9,7.75) 12(-14.9,7.25) 13(-14.9,6.75) 14(-14.9,6.25) 15(-14.9,5.75) 16(-14.9,5.25) 17(-14.9,4.75) 18(-14.9,4.25) 19(-14.9,3.75) 20(-14.9,3.25) 21(-14.9,2.75) 22(-14.9,2.25) 23(-14.9,1.75) 24(-14.9,1.25) 25(-14.9,0.75) 26(-14.9,0.25) 27(-14.9,-0.25) 28(-14.9,-0.75) 29(-14.9,-1.25) 30(-14.9,-1.75) 31(-14.9,-2.25) 32(-14.9,-2.75) 33(-14.9,-3.25) 34(-14.9,-3.75) 35(-14.9,-4.25) 36(-14.9,-4.75) 37(-14.9,-5.25) 38(-14.9,-5.75) 39(-14.9,-6.25) 40(-14.9,-6.75) 41(-14.9,-7.25) 42(-14.9,-7.75) 43(-14.9,-8.25) 44(-14.9,-8.75) 45(-14.9,-9.25) 46(-14.9,-9.75) 47(-14.9,-10.25) 48(-14.9,-10.75) 49(-14.9,-11.25) 50(-14.9,-11.75) 51(-14.9,-12.25) 52(-14.9,-12.75) 105(14.9,-12.75) 106(14.9,-12.25) 107(14.9,-11.75) 108(14.9,-11.25) 109(14.9,-10.75) 110(14.9,-10.25) 111(14.9,-9.75) 112(14.9,-9.25) 113(14.9,-8.75) 114(14.9,-8.25) 115(14.9,-7.75) 116(14.9,-7.25) 117(14.9,-6.75) 118(14.9,-6.25) 119(14.9,-5.75) 120(14.9,-5.25) 121(14.9,-4.75) 122(14.9,-4.25) 123(14.9,-3.75) 124(14.9,-3.25) 125(14.9,-2.75) 126(14.9,-2.25) 127(14.9,-1.75) 128(14.9,-1.25) 129(14.9,-0.75) 130(14.9,-0.25) 131(14.9,0.25) 132(14.9,0.75) 133(14.9,1.25) 134(14.9,1.75) 135(14.9,2.25) 136(14.9,2.75) 137(14.9,3.25) 138(14.9,3.75) 139(14.9,4.25) 140(14.9,4.75) 141(14.9,5.25) 142(14.9,5.75) 143(14.9,6.25) 144(14.9,6.75) 145(14.9,7.25) 146(14.9,7.75) 147(14.9,8.25) 148(14.9,8.75) 149(14.9,9.25) 150(14.9,9.75) 151(14.9,10.25) 152(14.9,10.75) 153(14.9,11.25) 154(14.9,11.75) 155(14.9,12.25) 156(14.9,12.75)
  oval 0.3x2.1 smd: 53(-12.75,-14.9) 54(-12.25,-14.9) 55(-11.75,-14.9) 56(-11.25,-14.9) 57(-10.75,-14.9) 58(-10.25,-14.9) 59(-9.75,-14.9) 60(-9.25,-14.9) 61(-8.75,-14.9) 62(-8.25,-14.9) 63(-7.75,-14.9) 64(-7.25,-14.9) 65(-6.75,-14.9) 66(-6.25,-14.9) 67(-5.75,-14.9) 68(-5.25,-14.9) 69(-4.75,-14.9) 70(-4.25,-14.9) 71(-3.75,-14.9) 72(-3.25,-14.9) 73(-2.75,-14.9) 74(-2.25,-14.9) 75(-1.75,-14.9) 76(-1.25,-14.9) 77(-0.75,-14.9) 78(-0.25,-14.9) 79(0.25,-14.9) 80(0.75,-14.9) 81(1.25,-14.9) 82(1.75,-14.9) 83(2.25,-14.9) 84(2.75,-14.9) 85(3.25,-14.9) 86(3.75,-14.9) 87(4.25,-14.9) 88(4.75,-14.9) 89(5.25,-14.9) 90(5.75,-14.9) 91(6.25,-14.9) 92(6.75,-14.9) 93(7.25,-14.9) 94(7.75,-14.9) 95(8.25,-14.9) 96(8.75,-14.9) 97(9.25,-14.9) 98(9.75,-14.9) 99(10.25,-14.9) 100(10.75,-14.9) 101(11.25,-14.9) 102(11.75,-14.9) 103(12.25,-14.9) 104(12.75,-14.9) 157(12.75,14.9) 158(12.25,14.9) 159(11.75,14.9) 160(11.25,14.9) 161(10.75,14.9) 162(10.25,14.9) 163(9.75,14.9) 164(9.25,14.9) 165(8.75,14.9) 166(8.25,14.9) 167(7.75,14.9) 168(7.25,14.9) 169(6.75,14.9) 170(6.25,14.9) 171(5.75,14.9) 172(5.25,14.9) 173(4.75,14.9) 174(4.25,14.9) 175(3.75,14.9) 176(3.25,14.9) 177(2.75,14.9) 178(2.25,14.9) 179(1.75,14.9) 180(1.25,14.9) 181(0.75,14.9) 182(0.25,14.9) 183(-0.25,14.9) 184(-0.75,14.9) 185(-1.25,14.9) 186(-1.75,14.9) 187(-2.25,14.9) 188(-2.75,14.9) 189(-3.25,14.9) 190(-3.75,14.9) 191(-4.25,14.9) 192(-4.75,14.9) 193(-5.25,14.9) 194(-5.75,14.9) 195(-6.25,14.9) 196(-6.75,14.9) 197(-7.25,14.9) 198(-7.75,14.9) 199(-8.25,14.9) 200(-8.75,14.9) 201(-9.25,14.9) 202(-9.75,14.9) 203(-10.25,14.9) 204(-10.75,14.9) 205(-11.25,14.9) 206(-11.75,14.9) 207(-12.25,14.9) 208(-12.75,14.9)
Top Overlay:
  circle w0.6: c-12.45,12.45 r0.3
  circle w0.25: c-14.9,13.45 r0.125
  lines w0.3: -13.45,-13.45 13.45,-13.45 13.45,13.45 -13.45,13.45 -13.45,-13.45
Mechanical 1:
  circle w0.2: c-13.1,13.1 r0.5
  lines w0.1: -15.494,-12.827 -15.494,-1.5 ; -15.494,-0.762 -15.494,0.762 ; -15.494,1.5 -15.494,12.827 ; -12.827,-15.494 -1.5,-15.494 ; -12.827,15.494 -1.5,15.494 ; -0.762,-15.494 0.762,-15.494 ; -0.762,15.494 0.762,15.494 ; 1.5,-15.494 12.827,-15.494 ; 1.5,15.494 12.827,15.494 ; 15.494,-12.827 15.494,-1.5 ; 15.494,-0.762 15.494,0.762 ; 15.494,1.5 15.494,12.827
  lines w0.2: -15.494,-12.827 -14,-12.827 ; -15.494,12.827 -14,12.827 ; -12.827,-15.494 -12.827,-14 ; -12.827,14 -12.827,15.494 ; 12.827,-15.494 12.827,-14 ; 12.827,14 12.827,15.494 ; 14,-12.827 15.494,-12.827 ; 14,12.827 15.494,12.827 ; -14,-14 14,-14 14,14 -14,14 -14,-14
  text ".Designator" at -1.61,0.85 h1.5
  text ".Comment" at -2.9,-1.7 h1.5
Mechanical 15:
  lines w0.1: -0.5,0 0.5,0 ; 0,-0.5 0,0.5 ; -16.45,-16.45 16.45,-16.45 16.45,16.45 -16.45,16.45 -16.45,-16.45
3D body: height 4.1, standoff 0, extent -14,-14 14,14